# Altium footprint library IC.PcbLib: 32 footprints (part 1 of 2)
Each footprint in its own frame and in the unit in brackets; x right, y up, seen from the top. Pads: shape width x height; smd on the part's side, far side on the other; paste and mask are expansions set on the pad; w line width, h text height; cw(c..) or ccw(c..) is an arc to the next point about the centre after c.
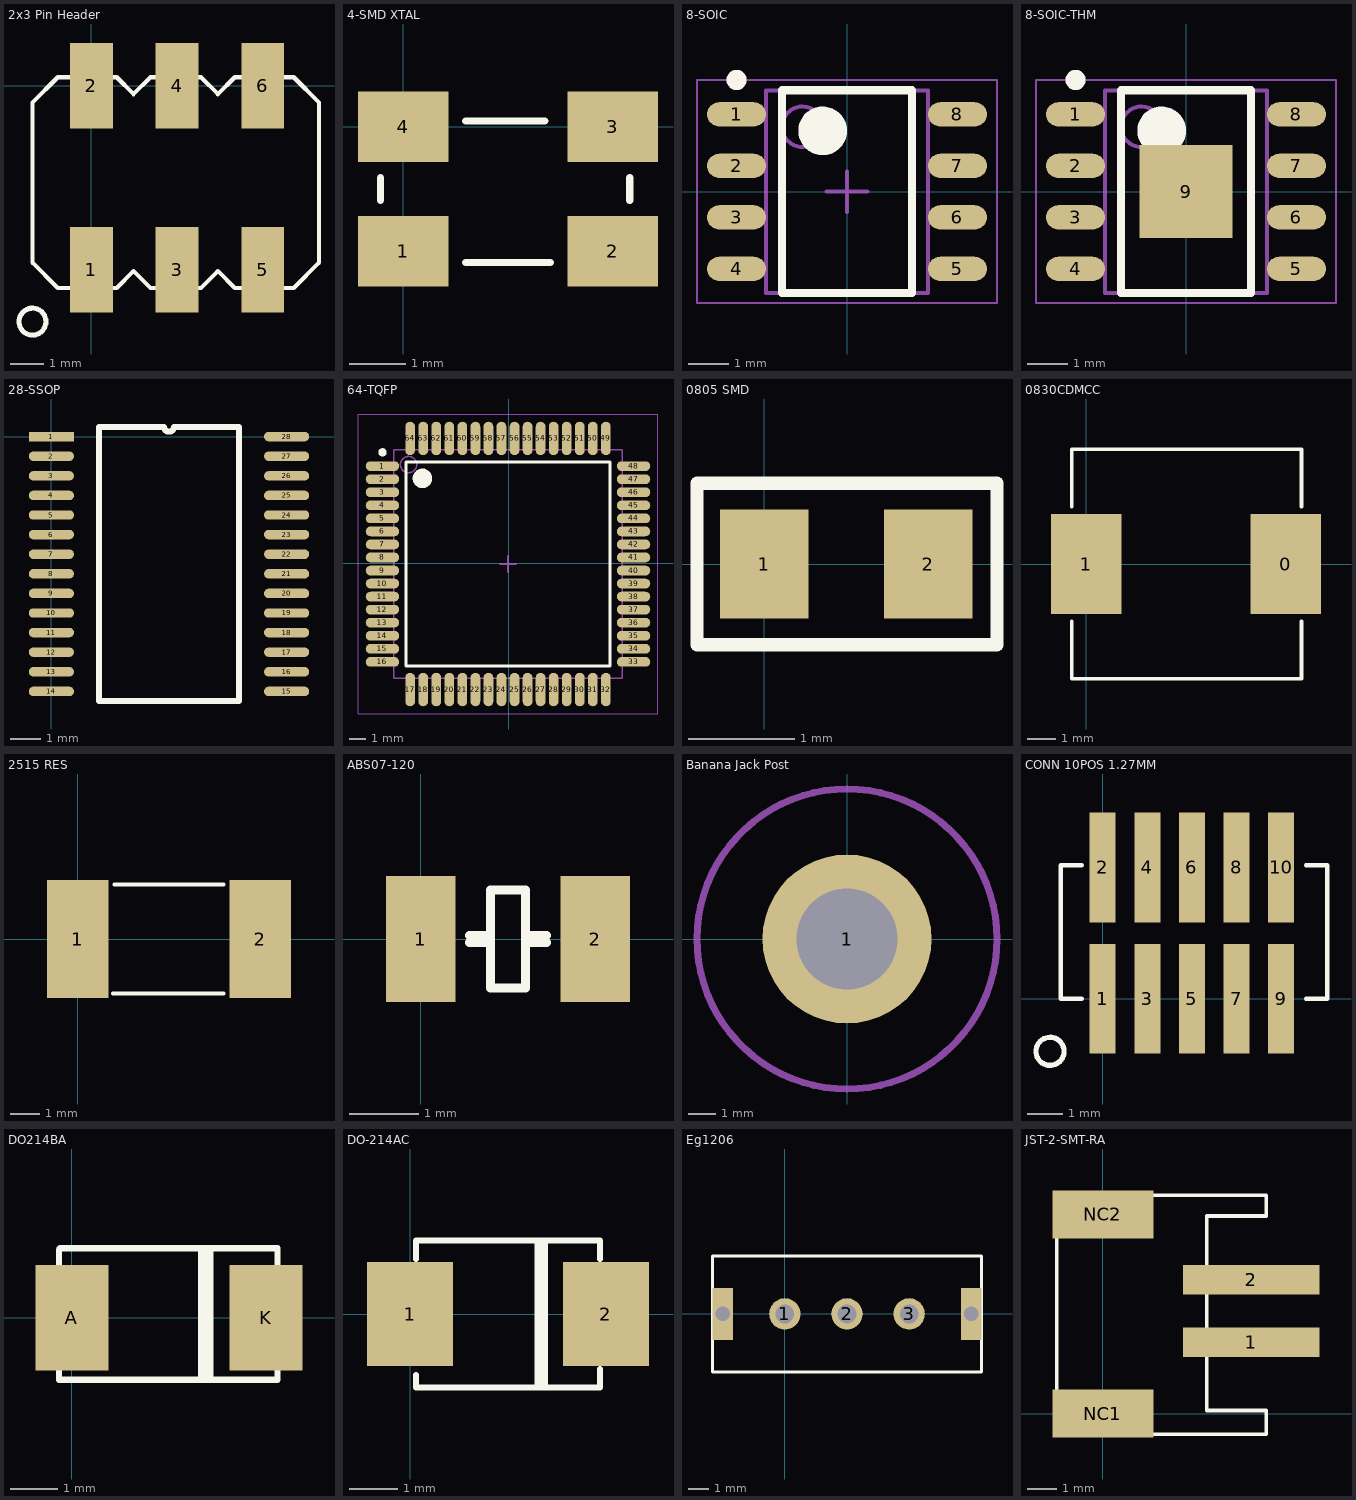
[diagram p0: the footprints below, top view; thin cyan lines are the x and y axes]

## 2x3 Pin Header [mm]
pads (6):
  rect 1.27x2.54 smd: 1(0,-5.46) 2(0,0) 3(2.54,-5.46) 4(2.54,0) 5(5.08,-5.46) 6(5.08,0)
Top Overlay:
  circle w0.15: c-1.75,-7 r0.4
  lines w0.127: -1.75,-5.25 -1.75,-0.5 -1,0.25 0.75,0.25 1.25,-0.25 1.75,0.25 3.25,0.25 3.75,-0.25 4.25,0.25 6,0.25 6.75,-0.5 6.75,-5.25 6,-6 4.25,-6 3.75,-5.5 3.25,-6 1.75,-6 1.25,-5.5 0.75,-6 -1,-6 -1.75,-5.25

## 4-SMD XTAL [mm]
pads (4):
  rect 1.6x1.25 smd: 1(0,-2.2) 2(3.7,-2.2) 3(3.7,0) 4(0,0)
Top Overlay:
  lines w0.127: -0.4,-1.3 -0.4,-0.9 ; 1.1,-2.4 2.6,-2.4 ; 1.1,0.1 2.5,0.1 ; 4,-1.3 4,-0.9
3D body "User Library-Crystal_SMD5032.step": height -1.74, standoff -2.6, extent -0.646,-2.692 4.298,0.508

## 8-SOIC [mm] "SOIC, 8-Leads, Body 4.90x3.90mm, Pitch 1.27mm, IPC Medium Density"
height 2.65
pads (8):
  oval 1.45x0.6 smd: 1(-2.725,1.905) 2(-2.725,0.635) 3(-2.725,-0.635) 4(-2.725,-1.905) 5(2.725,-1.905) 6(2.725,-0.635) 7(2.725,0.635) 8(2.725,1.905)
Top Overlay:
  circle w0.25: c-2.725,2.755 r0.125
  circle w0.6: c-0.6,1.5 r0.3
  lines w0.2: -1.6,-2.5 -1.6,2.5 1.6,2.5 1.6,-2.5 -1.6,-2.5
Mechanical 13:
  circle w0.1: c-1.1,1.6 r0.5
  lines w0.1: -2,-2.5 -2,2.5 2,2.5 2,-2.5 -2,-2.5
Mechanical 15:
  lines w0.05: -3.7,-2.75 -3.7,2.75 3.7,2.75 3.7,-2.75 -3.7,-2.75
  lines w0.1: -0.5,0 0.5,0 ; 0,-0.5 0,0.5
3D body "User Library-SOIC8_JEDEC_MS-012AA.step": height 1.75, standoff -0.01, extent -3.125,-2.5 3.074,2.5

## 8-SOIC-THM [mm] "SOIC, 8-Leads, Body 4.90x3.90mm, Pitch 1.27mm, IPC Medium Density"
height 2.65
pads (9):
  oval 1.45x0.6 smd: 1(-2.725,1.905) 2(-2.725,0.635) 3(-2.725,-0.635) 4(-2.725,-1.905) 5(2.725,-1.905) 6(2.725,-0.635) 7(2.725,0.635) 8(2.725,1.905)
  rect 2.29x2.29 smd: 9(0,0)
Top Overlay:
  circle w0.25: c-2.725,2.755 r0.125
  circle w0.6: c-0.6,1.5 r0.3
  lines w0.2: -1.6,-2.5 -1.6,2.5 1.6,2.5 1.6,-2.5 -1.6,-2.5
Mechanical 13:
  circle w0.1: c-1.1,1.6 r0.5
  lines w0.1: -2,-2.5 -2,2.5 2,2.5 2,-2.5 -2,-2.5
Mechanical 15:
  lines w0.05: -3.7,-2.75 -3.7,2.75 3.7,2.75 3.7,-2.75 -3.7,-2.75
  lines w0.1: -0.5,0 0.5,0 ; 0,-0.5 0,0.5
3D body "User Library-SOIC8_JEDEC_MS-012AA.step": height 1.75, standoff -0.01, extent -3.1,-2.5 3.1,2.5

## 28-SSOP [mm]
pads (28):
  rect 1.5x0.312 smd: 1(0,0)
  oval 1.5x0.312 smd: 2(0,-0.65) 3(0,-1.3) 4(0,-1.95) 5(0,-2.6) 6(0,-3.25) 7(0,-3.9) 8(0,-4.55) 9(0,-5.2) 10(0,-5.85) 11(0,-6.5) 12(0,-7.15) 13(0,-7.8) 14(0,-8.45) 15(7.8,-8.45) 16(7.8,-7.8) 17(7.8,-7.15) 18(7.8,-6.5) 19(7.8,-5.85) 20(7.8,-5.2) 21(7.8,-4.55) 22(7.8,-3.9) 23(7.8,-3.25) 24(7.8,-2.6) 25(7.8,-1.95) 26(7.8,-1.3) 27(7.8,-0.65) 28(7.8,0)
Top Overlay:
  lines w0.2: 1.585,-8.775 6.215,-8.775 6.215,0.325 4.062,0.325 cw(c3.9,0.325) 3.738,0.325 1.585,0.325 1.585,-8.775
3D body "User Library-SSOP-28-2.step": height 2, standoff 0, extent -0.006,-9.3 7.806,0.9

## 64-TQFP [mm]
pads (64):
  oval 2.05x0.6 smd: 1(-7.738,5.969) 2(-7.738,5.169) 3(-7.738,4.369) 4(-7.738,3.569) 5(-7.738,2.769) 6(-7.738,1.969) 7(-7.738,1.169) 8(-7.738,0.369) 9(-7.738,-0.431) 10(-7.738,-1.231) 11(-7.738,-2.031) 12(-7.738,-2.831) 13(-7.738,-3.631) 14(-7.738,-4.431) 15(-7.738,-5.231) 16(-7.738,-6.031) 33(7.662,-6.031) 34(7.662,-5.231) 35(7.662,-4.431) 36(7.662,-3.631) 37(7.662,-2.831) 38(7.662,-2.031) 39(7.662,-1.231) 40(7.662,-0.431) 41(7.662,0.369) 42(7.662,1.169) 43(7.662,1.969) 44(7.662,2.769) 45(7.662,3.569) 46(7.662,4.369) 47(7.662,5.169) 48(7.662,5.969)
  oval 0.6x2.05 smd: 17(-6.038,-7.731) 18(-5.238,-7.731) 19(-4.438,-7.731) 20(-3.638,-7.731) 21(-2.838,-7.731) 22(-2.038,-7.731) 23(-1.238,-7.731) 24(-0.438,-7.731) 25(0.362,-7.731) 26(1.162,-7.731) 27(1.962,-7.731) 28(2.762,-7.731) 29(3.562,-7.731) 30(4.362,-7.731) 31(5.162,-7.731) 32(5.962,-7.731) 49(5.962,7.669) 50(5.162,7.669) 51(4.362,7.669) 52(3.562,7.669) 53(2.762,7.669) 54(1.962,7.669) 55(1.162,7.669) 56(0.362,7.669) 57(-0.438,7.669) 58(-1.238,7.669) 59(-2.038,7.669) 60(-2.838,7.669) 61(-3.638,7.669) 62(-4.438,7.669) 63(-5.238,7.669) 64(-6.038,7.669)
Top Overlay:
  circle w0.6: c-5.288,5.219 r0.3
  circle w0.25: c-7.738,6.819 r0.125
  lines w0.2: -6.288,-6.281 6.212,-6.281 6.212,6.219 -6.288,6.219 -6.288,-6.281
Mechanical 13:
  circle w0.1: c-6.138,6.069 r0.5
  lines w0.1: -7.038,-7.031 6.962,-7.031 6.962,6.969 -7.038,6.969 -7.038,-7.031
Mechanical 15:
  lines w0.05: -9.238,-9.231 9.162,-9.231 9.162,9.169 -9.238,9.169 -9.238,-9.231
  lines w0.1: -0.538,-0.031 0.462,-0.031 ; -0.038,-0.531 -0.038,0.469
3D body "User Library-atmega64 (tqfp64).step": height 1.13, standoff 0.03, extent -8.044,-8.12 7.956,7.88

## 0805 SMD [mm]
pads (2):
  rect 0.838x1.031 smd: 1(0,0) 2(1.55,0)
Top Overlay:
  lines w0.127: -0.635,-0.762 -0.635,0.762 2.2,0.762 2.2,-0.762 -0.635,-0.762
3D body "User Library-0805.step": height 0.81, standoff -0.01, extent -0.2,-0.625 1.8,0.625

## 0830CDMCC [mm]
pads (2):
  rect 2.45x3.5 smd: 0(6.95,0) 1(0,0)
Top Overlay:
  lines w0.127: -0.5,-2 -0.5,-4 7.5,-4 7.5,-2 ; -0.5,2 -0.5,4 7.5,4 7.5,2

## 2515 RES [mm]
pads (2):
  rect 2.1x4 smd: 1(0,0) 2(6.2,0)
Top Overlay:
  lines w0.127: 1.2,-1.85 4.95,-1.85 ; 1.25,1.85 4.95,1.85
3D body "User Library-2512 SMD Resistor.step": height 1.6, standoff 0, extent -0.175,-1.5 6.175,1.5

## ABS07-120 [mm]
pads (2):
  rect 1x1.8 smd: 1(0,0) 2(2.5,0)
Top Overlay:
  lines w0.127: 0.7,-0.05 1,-0.05 ; 0.7,0.05 1,0.05 ; 1.5,-0.05 1.8,-0.05 ; 1.5,0.05 1.8,0.05 ; 1,-0.7 1.5,-0.7 1.5,0.7 1,0.7 1,-0.7
3D body "User Library ABS07-120.STEP": height 0.89, standoff 0, extent -0.353,-0.754 2.853,0.75

## Banana Jack Post [mil]
pads (1):
  round 240 hole 144: 1(0,0)
Mechanical 1:
  circle w10: c0,0 r213
3D body "keystone-PN7007.STEP": height 1058.65, standoff -410.35, extent -226.12,-223.18 222,225

## CONN 10POS 1.27MM [mm] "CONN HEADER VERT 10POS 2.54MM"
pads (10):
  rect 0.74x3.125 smd: 1(0,0) 2(0,3.735) 3(1.27,0) 4(1.27,3.735) 5(2.54,0) 6(2.54,3.735) 7(3.81,0) 8(3.81,3.735) 9(5.08,0) 10(5.08,3.735)
Top Overlay:
  circle w0.15: c-1.5,-1.5 r0.4
  lines w0.127: -0.6,0 -1.2,0 -1.2,3.8 ; 5.788,3.798 6.388,3.798 6.388,-0.002 ; -1.2,3.8 -0.6,3.8 -1.2,3.8 ; 6.388,-0.002 5.788,-0.002 6.388,-0.002

## DO214BA [mil]
pads (2):
  rect 60x87 smd: A(0,0) K(160,0)
Top Overlay:
  lines w5: 106.3,-49.21 106.3,57.09 ; 110.24,-49.21 110.24,55.12 ; 114.17,-49.21 114.17,57.09 ; -10.71,-51.18 14.61,-51.18 104.61,-51.18 169.29,-51.18 169.29,57.09 -9.84,57.09 -10.71,56.22 -10.71,-51.18
3D body "User Library-DO-214BA.step": height 118.21, standoff 1.97, extent -24.6,-49.21 182.09,53.15

## DO-214AC [mil]
pads (2):
  rect 70x85 smd: 1(0,0) 2(160,0)
Top Overlay:
  lines w5: 5,-50 5,-60 155,-60 155,-45 ; 5,45 5,60 155,60 155,45 ; 104,-60 104,60 ; 108,60 108,-60 110,-60 110,60
3D body "User Library-DO-214AC SMA.step": height 94.47, standoff -0.12, extent -22.36,-49.19 182.37,53.17

## Eg1206 [mm]
pads (5):
  round 1.524 hole 0.9: 1(0,0) 2(3,0) 3(6,0)
  rect 1x2.5 hole 0.7 square: ""(-3,0) ""(9,0)
Top Overlay:
  lines w0.127: -3.5,-2.803 9.5,-2.803 9.5,2.797 ; -3.5,-2.8 -3.5,2.8 9.5,2.8
3D body: height 6, standoff 0, extent -3.5,-2.7 9.5,2.9

## JST-2-SMT-RA [mm]
pads (4):
  rect 4.6x1 smd: 1(5,2.4) 2(5,4.5)
  rect 3.4x1.6 smd: NC1(0,0) NC2(0,6.7)
Top Overlay:
  lines w0.127: -1.55,-0.7 -1.55,7.35 5.5,7.35 5.5,7.05 5.5,6.65 3.5,6.65 3.5,0.1 5.5,0.1 5.5,-0.7 -1.55,-0.7
3D body "User Library-S2B-PH-SM4-TB.step": height 5.58, standoff -0.02, extent -1.531,-0.534 7.069,7.366